# Altium footprint library IC_QFN.PcbLib: 25 footprints (part 3 of 3)
Each footprint in its own frame and in the unit in brackets; x right, y up, seen from the top. Pads: shape width x height; smd on the part's side, far side on the other; paste and mask are expansions set on the pad; w line width, h text height; cw(c..) or ccw(c..) is an arc to the next point about the centre after c.
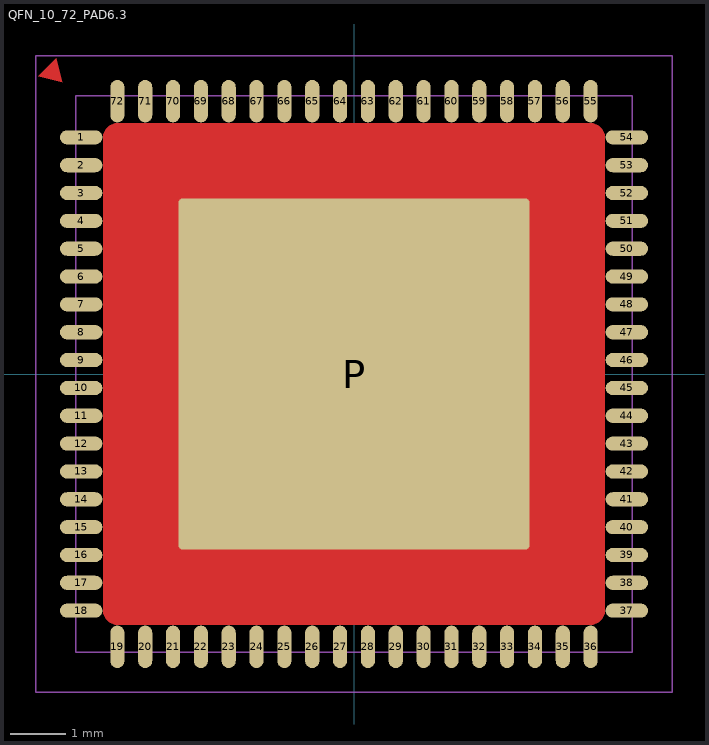
[diagram p2: the footprint, top view; thin cyan lines are the x and y axes]

## QFN_10_72_PAD6.3 [mm]
pads (73):
  oval 0.762x0.254 smd paste+0 mask+0.051: 1(-4.9,4.25) 2(-4.9,3.75) 3(-4.9,3.25) 4(-4.9,2.75) 5(-4.9,2.25) 6(-4.9,1.75) 7(-4.9,1.25) 8(-4.9,0.75) 9(-4.9,0.25) 10(-4.9,-0.25) 11(-4.9,-0.75) 12(-4.9,-1.25) 13(-4.9,-1.75) 14(-4.9,-2.25) 15(-4.9,-2.75) 16(-4.9,-3.25) 17(-4.9,-3.75) 18(-4.9,-4.25) 37(4.9,-4.25) 38(4.9,-3.75) 39(4.9,-3.25) 40(4.9,-2.75) 41(4.9,-2.25) 42(4.9,-1.75) 43(4.9,-1.25) 44(4.9,-0.75) 45(4.9,-0.25) 46(4.9,0.25) 47(4.9,0.75) 48(4.9,1.25) 49(4.9,1.75) 50(4.9,2.25) 51(4.9,2.75) 52(4.9,3.25) 53(4.9,3.75) 54(4.9,4.25)
  oval 0.254x0.762 smd paste+0 mask+0.051: 19(-4.25,-4.9) 20(-3.75,-4.9) 21(-3.25,-4.9) 22(-2.75,-4.9) 23(-2.25,-4.9) 24(-1.75,-4.9) 25(-1.25,-4.9) 26(-0.75,-4.9) 27(-0.25,-4.9) 28(0.25,-4.9) 29(0.75,-4.9) 30(1.25,-4.9) 31(1.75,-4.9) 32(2.25,-4.9) 33(2.75,-4.9) 34(3.25,-4.9) 35(3.75,-4.9) 36(4.25,-4.9) 55(4.25,4.9) 56(3.75,4.9) 57(3.25,4.9) 58(2.75,4.9) 59(2.25,4.9) 60(1.75,4.9) 61(1.25,4.9) 62(0.75,4.9) 63(0.25,4.9) 64(-0.25,4.9) 65(-0.75,4.9) 66(-1.25,4.9) 67(-1.75,4.9) 68(-2.25,4.9) 69(-2.75,4.9) 70(-3.25,4.9) 71(-3.75,4.9) 72(-4.25,4.9)
  rrect2% 6.3x6.3 smd paste-12.7 mask+0.051: P(0,0)
Top Layer:
  pour cut-out: 4.5,4.25 4.5,4.3 4.462,4.392 4.392,4.462 4.3,4.5 4.25,4.5 -4.25,4.5 -4.3,4.5 -4.392,4.462 -4.462,4.392 -4.5,4.3 -4.5,4.25 -4.5,-4.25 -4.5,-4.3 -4.462,-4.392 -4.392,-4.462 -4.3,-4.5 -4.25,-4.5 4.25,-4.5 4.3,-4.5 4.392,-4.462 4.462,-4.392 4.5,-4.3 4.5,-4.25
  region: -5.239,5.239 -5.347,5.67 -5.67,5.347
Top Paste:
  region: 1.016,1.397 1.016,3.048 -1.016,3.048 -1.016,1.397
  region: -1.397,1.397 -1.397,3.048 -3.048,3.048 -3.048,1.397
  region: 1.016,-1.016 1.016,1.016 -1.016,1.016 -1.016,-1.016
  region: -1.397,-1.397 -3.048,-1.397 -3.048,-3.048 -1.397,-3.048
  region: -1.397,1.016 -3.048,1.016 -3.048,-1.016 -1.397,-1.016
  region: 1.397,-1.397 1.397,-3.048 3.048,-3.048 3.048,-1.397
  region: -1.016,-1.397 -1.016,-3.048 1.016,-3.048 1.016,-1.397
  rectangle: 1.397,1.397 3.048,3.048
  rectangle: 1.397,-1.016 3.048,1.016
Top Component Outline:
  lines w0.025: -5.715,-5.715 5.715,-5.715 5.715,5.715 -5.715,5.715 -5.715,-5.715
Top 3D Body (Mech16):
  lines w0.025: -5,-5 5,-5 5,5 -5,5 -5,-5
3D body: height 0.25, standoff 0, extent 4.75,4.123 5.004,4.377
3D body: height 0.25, standoff 0, extent 4.123,-5.004 4.377,-4.75
3D body: height 0.89, standoff 0, extent -5,-5 5,5
3D body: height 0.25, standoff 0, extent 4.124,4.75 4.378,5.004
3D body: height 0.25, standoff 0, extent 4.75,-4.378 5.004,-4.124
3D body: height 0.25, standoff 0, extent -4.378,-5.004 -4.124,-4.75
3D body: height 0.25, standoff 0, extent -5.004,-4.377 -4.75,-4.123
3D body: height 0.25, standoff 0, extent -5.004,-3.877 -4.75,-3.623
3D body: height 0.25, standoff 0, extent -4.377,4.75 -4.123,5.004
3D body: height 0.25, standoff 0, extent 4.75,-3.378 5.004,-3.124
3D body: height 0.25, standoff 0, extent 4.75,-3.878 5.004,-3.624
3D body: height 0.25, standoff 0, extent 4.75,-2.878 5.004,-2.624
3D body: height 0.25, standoff 0, extent 4.75,-2.378 5.004,-2.124
3D body: height 0.25, standoff 0, extent 4.75,3.623 5.004,3.877
3D body: height 0.25, standoff 0, extent 4.75,3.123 5.004,3.377
3D body: height 0.25, standoff 0, extent 4.75,2.623 5.004,2.877
3D body: height 0.25, standoff 0, extent 4.75,2.123 5.004,2.377
3D body: height 0.25, standoff 0, extent 4.75,1.623 5.004,1.877
3D body: height 0.25, standoff 0, extent 4.75,1.123 5.004,1.377
3D body: height 0.25, standoff 0, extent 4.75,0.623 5.004,0.877
3D body: height 0.25, standoff 0, extent 4.75,0.123 5.004,0.377
3D body: height 0.25, standoff 0, extent 4.75,-0.377 5.004,-0.123
3D body: height 0.25, standoff 0, extent 4.75,-0.877 5.004,-0.623
3D body: height 0.25, standoff 0, extent 4.75,-1.377 5.004,-1.123
3D body: height 0.25, standoff 0, extent 4.75,-1.877 5.004,-1.623
3D body: height 0.25, standoff 0, extent 1.623,4.75 1.877,5.004
3D body: height 0.25, standoff 0, extent 1.123,4.75 1.377,5.004
3D body: height 0.25, standoff 0, extent 0.623,4.75 0.877,5.004
3D body: height 0.25, standoff 0, extent 0.123,4.75 0.377,5.004
3D body: height 0.25, standoff 0, extent -0.377,4.75 -0.123,5.004
3D body: height 0.25, standoff 0, extent -0.877,4.75 -0.623,5.004
3D body: height 0.25, standoff 0, extent -1.377,4.75 -1.123,5.004
3D body: height 0.25, standoff 0, extent -1.877,4.75 -1.623,5.004
3D body: height 0.25, standoff 0, extent -2.377,4.75 -2.123,5.004
3D body: height 0.25, standoff 0, extent -2.877,4.75 -2.623,5.004
3D body: height 0.25, standoff 0, extent -3.377,4.75 -3.123,5.004
3D body: height 0.25, standoff 0, extent -3.877,4.75 -3.623,5.004
3D body: height 0.25, standoff 0, extent 2.124,4.75 2.378,5.004
3D body: height 0.25, standoff 0, extent 2.624,4.75 2.878,5.004
3D body: height 0.25, standoff 0, extent 3.624,4.75 3.878,5.004
3D body: height 0.25, standoff 0, extent 3.124,4.75 3.378,5.004
3D body: height 0.25, standoff 0, extent -5.004,2.123 -4.75,2.377
3D body: height 0.25, standoff 0, extent -5.004,1.623 -4.75,1.877
3D body: height 0.25, standoff 0, extent -5.004,1.123 -4.75,1.377
3D body: height 0.25, standoff 0, extent -5.004,0.623 -4.75,0.877
3D body: height 0.25, standoff 0, extent -5.004,0.123 -4.75,0.377
3D body: height 0.25, standoff 0, extent -5.004,-0.377 -4.75,-0.123
3D body: height 0.25, standoff 0, extent -5.004,-0.877 -4.75,-0.623
3D body: height 0.25, standoff 0, extent -5.004,-1.377 -4.75,-1.123
3D body: height 0.25, standoff 0, extent -5.004,-1.877 -4.75,-1.623
3D body: height 0.25, standoff 0, extent -5.004,-2.377 -4.75,-2.123
3D body: height 0.25, standoff 0, extent -5.004,-2.877 -4.75,-2.623
3D body: height 0.25, standoff 0, extent -5.004,-3.377 -4.75,-3.123
3D body: height 0.25, standoff 0, extent -5.004,2.624 -4.75,2.878
3D body: height 0.25, standoff 0, extent -5.004,3.124 -4.75,3.378
3D body: height 0.25, standoff 0, extent -5.004,4.124 -4.75,4.378
3D body: height 0.25, standoff 0, extent -5.004,3.624 -4.75,3.878
3D body: height 0.25, standoff 0, extent -1.877,-5.004 -1.623,-4.75
3D body: height 0.25, standoff 0, extent -1.377,-5.004 -1.123,-4.75
3D body: height 0.25, standoff 0, extent -0.877,-5.004 -0.623,-4.75
3D body: height 0.25, standoff 0, extent -0.377,-5.004 -0.123,-4.75
3D body: height 0.25, standoff 0, extent 0.123,-5.004 0.377,-4.75
3D body: height 0.25, standoff 0, extent 0.623,-5.004 0.877,-4.75
3D body: height 0.25, standoff 0, extent 1.123,-5.004 1.377,-4.75
3D body: height 0.25, standoff 0, extent 1.623,-5.004 1.877,-4.75
3D body: height 0.25, standoff 0, extent 2.123,-5.004 2.377,-4.75
3D body: height 0.25, standoff 0, extent 2.623,-5.004 2.877,-4.75
3D body: height 0.25, standoff 0, extent 3.123,-5.004 3.377,-4.75
3D body: height 0.25, standoff 0, extent 3.623,-5.004 3.877,-4.75
3D body: height 0.25, standoff 0, extent -2.378,-5.004 -2.124,-4.75
3D body: height 0.25, standoff 0, extent -2.878,-5.004 -2.624,-4.75
3D body: height 0.25, standoff 0, extent -3.878,-5.004 -3.624,-4.75
3D body: height 0.25, standoff 0, extent -3.378,-5.004 -3.124,-4.75